# Altium footprint library PcbLib.PcbLib: 79 footprints (part 1 of 5)
Each footprint in its own frame and in the unit in brackets; x right, y up, seen from the top. Pads: shape width x height; smd on the part's side, far side on the other; paste and mask are expansions set on the pad; w line width, h text height; cw(c..) or ccw(c..) is an arc to the next point about the centre after c.
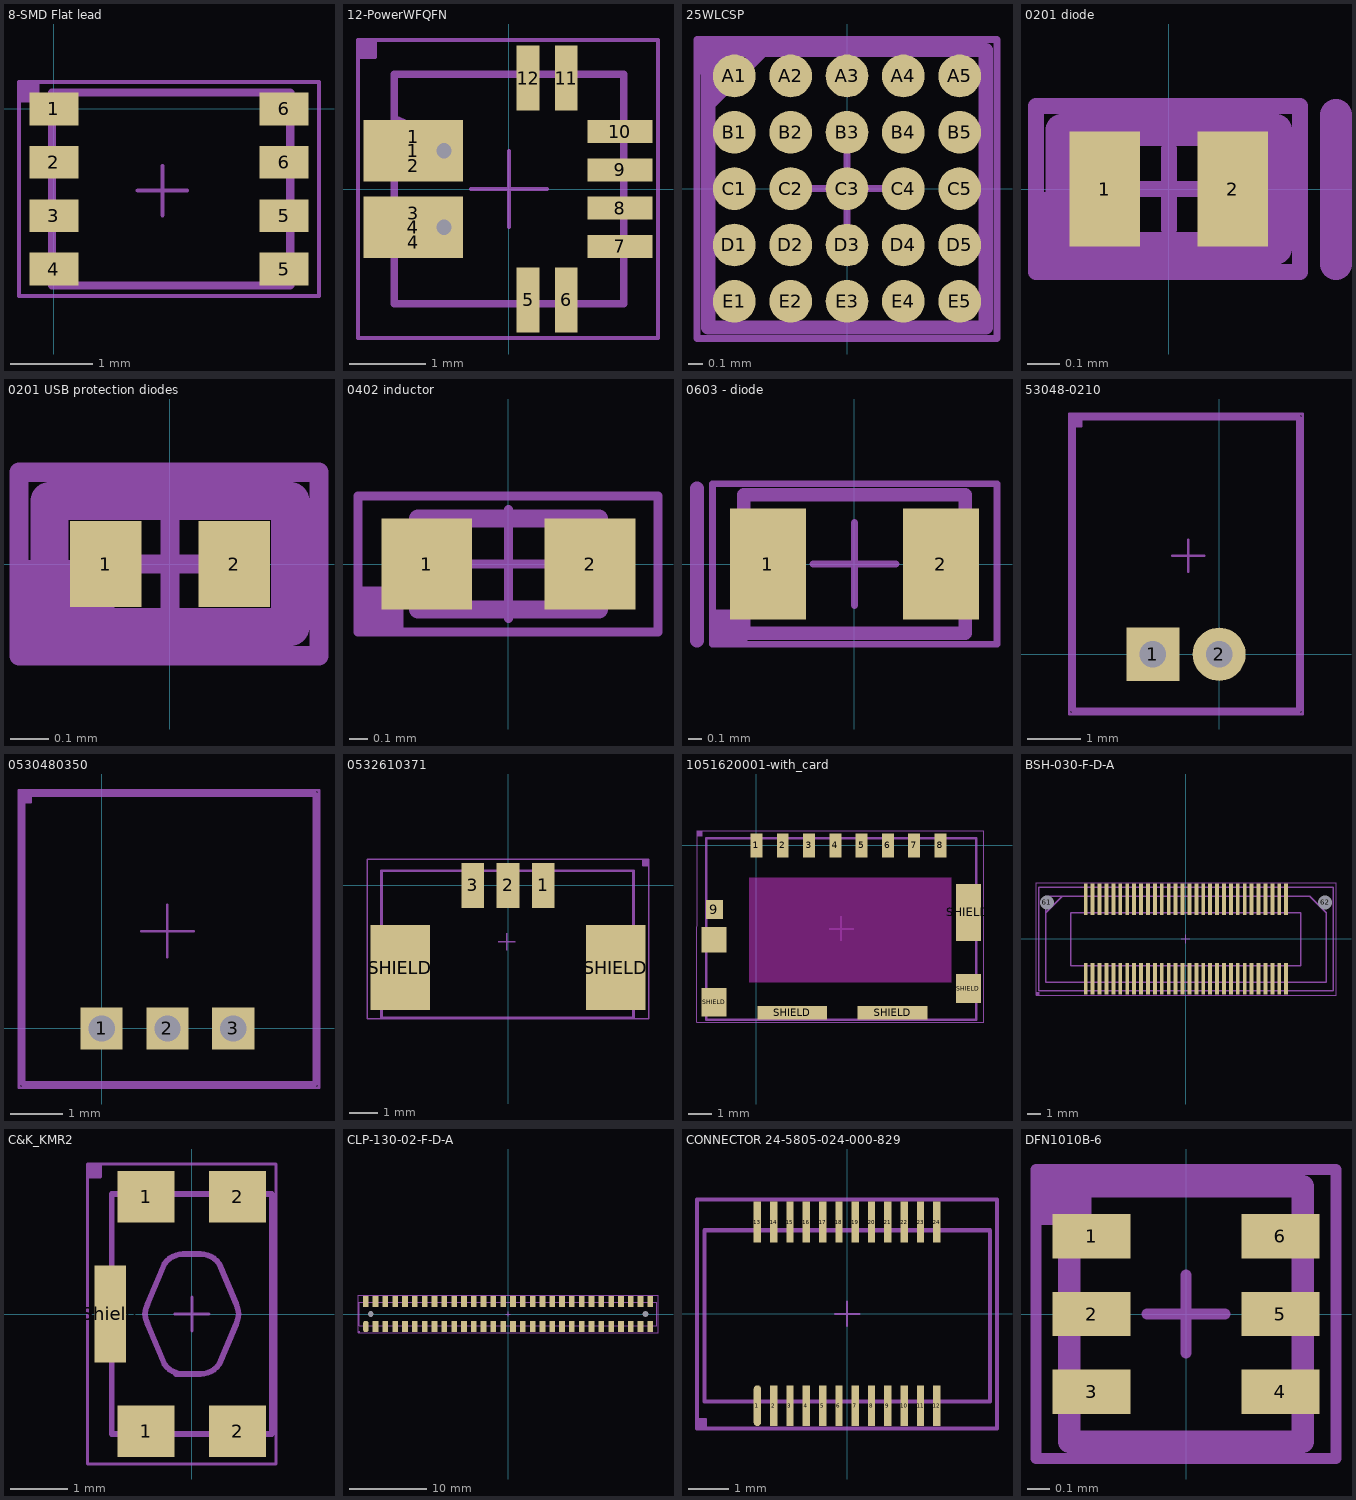
[diagram p0: the footprints below, top view; thin cyan lines are the x and y axes]

## 8-SMD Flat lead [mm]
pads (8):
  rect 0.6x0.4 smd: 1(0,0) 2(0,-0.65) 3(0,-1.3) 4(0,-1.95) 5(2.8,-1.95) 5(2.8,-1.3) 6(2.8,-0.65) 6(2.8,0)
TopBody:
  lines w0.1: -0.025,-2.15 2.875,-2.15 2.875,0.2 -0.025,0.2 -0.025,-2.15
TopCourtyard:
  region: -0.425,0.325 -0.425,0.1 -0.2,0.1 -0.2,0.325
  lines w0.05: -0.425,0.1 -0.2,0.1 -0.2,0.325 ; 1.02,-0.995 1.62,-0.995 ; 1.32,-1.295 1.32,-0.695 ; -0.425,-2.275 3.225,-2.275 3.225,0.325 -0.425,0.325 -0.425,-2.275
3D body: height 0.9, standoff 0, extent -0.025,-2.15 2.875,0.2

## 12-PowerWFQFN [mm]
height 0.75
pads (14):
  rect 1.3x0.8 smd mask+0.05: 1(-1.25,0.5) 4(-1.25,-0.5)
  rect 0.5x0.3 smd paste-0.5 mask+0.05: 1(-1.25,0.682) 2(-1.25,0.301) 3(-1.25,-0.318) 4(-1.25,-0.699)
  rect 0.3x0.85 smd mask+0.05: 5(0.25,-1.45) 6(0.75,-1.45) 11(0.75,1.45) 12(0.25,1.45)
  rect 0.85x0.3 smd mask+0.05: 7(1.45,-0.75) 8(1.45,-0.25) 9(1.45,0.25) 10(1.45,0.75)
via -0.85,0.5 diameter 0.4 hole 0.2
via -0.85,-0.5 diameter 0.4 hole 0.2
TopBody:
  lines w0.1: -1.5,0.44 -0.96,0.68 -1.5,0.92 ; -1.5,-1.5 1.5,-1.5 1.5,1.5 -1.5,1.5 -1.5,-1.5
TopCourtyard:
  region: -1.975,1.95 -1.975,1.725 -1.75,1.725 -1.75,1.95
  lines w0.05: -1.975,1.725 -1.75,1.725 -1.75,1.95 ; -0.5,0 0,0 ; 0,-0.5 0,0 ; 0,0.5 0,0 ; 0.5,0 0,0 ; -1.975,-1.95 1.95,-1.95 1.95,1.95 -1.975,1.95 -1.975,-1.95
3D body: height 0.59, standoff 0, extent 4.95,5.175 4.95,5.175
3D body "EX.STEP": height 0.74, standoff 0.01, extent -1.5,-1.5 1.5,1.5

## 25WLCSP [mm]
height 0.56
pads (25):
  round 0.304 smd paste-0.039 mask-0.039: A1(-0.8,0.8) A2(-0.4,0.8) A3(0,0.8) A4(0.4,0.8) A5(0.8,0.8) B1(-0.8,0.4) B2(-0.4,0.4) B3(0,0.4) B4(0.4,0.4) B5(0.8,0.4) C1(-0.8,0) C2(-0.4,0) C3(0,0) C4(0.4,0) C5(0.8,0) D1(-0.8,-0.4) D2(-0.4,-0.4) D3(0,-0.4) D4(0.4,-0.4) D5(0.8,-0.4) E1(-0.8,-0.8) E2(-0.4,-0.8) E3(0,-0.8) E4(0.4,-0.8) E5(0.8,-0.8)
TopBody:
  lines w0.1: -0.984,0.602 -0.611,0.975 ; -0.985,-0.985 0.985,-0.985 0.985,0.985 -0.985,0.985 -0.985,-0.985
TopCourtyard:
  region: -1.065,1.06 -1.065,0.835 -0.84,0.835 -0.84,1.06
  lines w0.05: -1.065,0.835 -0.84,0.835 -0.84,1.06 ; -0.3,0 0.3,0 ; 0,-0.3 0,0.3 ; -1.065,-1.065 -1.065,1.06 1.065,1.06 1.065,-1.065 -1.065,-1.065
3D body: height 0.57, standoff 0.56, extent -0.906,0.706 -0.706,0.905
3D body: height 0.56, standoff 0, extent -0.985,-0.985 0.985,0.985

## 0201 diode [mm] "for 0201 mcsemi diode"
height 0.3
pads (2):
  rect 0.22x0.36 smd mask+0.05: 1(-0.2,0) 2(0.2,0)
Top Solder:
  rectangle: -0.195,-0.23 0.195,0.23
TopBody:
  lines w0.1: -0.335,-0.185 0.335,-0.185 0.335,0.185 -0.335,0.185 -0.335,-0.185
TopCourtyard:
  rectangle: -0.415,-0.26 -0.19,-0.035
  lines w0.05: -0.415,-0.035 -0.19,-0.035 -0.19,-0.26 ; -0.155,0 0.16,0 ; 0,-0.125 0,0.125 ; -0.415,-0.26 -0.415,0.26 0.41,0.26 0.41,-0.26 -0.415,-0.26
  lines w0.1: 0.522,-0.235 0.522,0.231
3D body: height 0.25, standoff 0, extent 1.325,0.2 1.325,0.2
3D body: height 0.34, standoff 0, extent 0.175,-0.185 0.335,0.185
3D body: height 0.34, standoff 0, extent -0.335,-0.185 0.175,0.185

## 0201 USB protection diodes [mm] "USB PROTECTION ST"
height 0.3
pads (2):
  rect 0.187x0.225 smd: 1(-0.169,0) 2(0.169,0)
TopBody:
  lines w0.1: -0.315,-0.165 0.315,-0.165 0.315,0.165 -0.315,0.165 -0.315,-0.165
TopCourtyard:
  rectangle: -0.395,-0.24 -0.17,-0.015
  lines w0.05: -0.395,-0.015 -0.17,-0.015 -0.17,-0.24 ; -0.165,0 0.165,0 ; 0,-0.165 0,0.165 ; -0.395,-0.24 0.39,-0.24 0.39,0.24 -0.395,0.24 -0.395,-0.24
3D body: height 0.3, standoff 0, extent 0.175,-0.164 0.315,0.165
3D body: height 0.3, standoff 0, extent -0.314,-0.164 0.175,0.165

## 0402 inductor [mm]
height 0.5
pads (2):
  rect 0.5x0.5 smd: 1(-0.45,0) 2(0.45,0)
TopBody:
  lines w0.1: -0.5,-0.25 0.5,-0.25 0.5,0.25 -0.5,0.25 -0.5,-0.25
TopCourtyard:
  rectangle: -0.83,-0.375 -0.605,-0.15
  lines w0.05: -0.83,-0.15 -0.605,-0.15 -0.605,-0.375 ; -0.3,0 0.3,0 ; 0,-0.3 0,0.3 ; -0.83,-0.375 0.825,-0.375 0.825,0.375 -0.83,0.375 -0.83,-0.375
3D body: height 0.5, standoff 0, extent -0.5,-0.25 -0.4,0.25
3D body: height 0.5, standoff 0, extent -0.4,-0.25 0.4,0.25
3D body: height 0.5, standoff 0, extent 0.4,-0.25 0.5,0.25

## 0603 - diode [mm]
height 0.55
pads (2):
  rect 0.55x0.8 smd paste-0.015: 1(-0.625,0) 2(0.625,0)
TopBody:
  lines w0.1: -0.8,-0.5 -0.8,0.5 0.8,0.5 0.8,-0.5 -0.8,-0.5
TopCourtyard:
  region: -1.025,-0.355 -1.025,-0.58 -0.8,-0.58 -0.8,-0.355
  lines w0.05: -1.025,-0.355 -0.8,-0.355 -0.8,-0.58 ; -0.3,0 0.3,0 ; 0,-0.3 0,0.3 ; -1.025,-0.58 -1.025,0.58 1.03,0.58 1.03,-0.58 -1.025,-0.58
  lines w0.1: -1.138,-0.555 -1.138,0.546
3D body: height 0.51, standoff 0.5, extent -0.72,-0.421 -0.521,-0.221
3D body: height 0.5, standoff 0, extent -0.8,-0.5 0.8,0.5

## 53048-0210 [mm]
height 3.5
pads (2):
  rect 1x1 hole 0.5: 1(-1.25,0)
  round 1 hole 0.5: 2(0,0)
TopBody:
  lines w0.1: -2.75,-1.05 1.5,-1.05 1.5,4.45 -2.75,4.45 -2.75,-1.05
TopCourtyard:
  region: -2.825,4.525 -2.825,4.3 -2.6,4.3 -2.6,4.525
  lines w0.05: -2.825,4.3 -2.6,4.3 -2.6,4.525 ; -0.885,1.855 -0.285,1.855 ; -0.585,1.555 -0.585,2.155 ; -2.825,-1.125 -2.825,4.525 1.575,4.525 1.575,-1.125 -2.825,-1.125
3D body "530480210.stp": height 3.5, standoff -2.3, extent -2.75,-1.05 1.5,4.45

## 0530480350 [mm]
height 3.5
pads (3):
  rect 0.8x0.8 / inner round 0.8 / far side rect 0.8x0.8 hole 0.5: 1(0,0) 2(1.25,0) 3(2.5,0)
TopBody:
  lines w0.1: -1.495,-1.05 -1.495,4.45 4.055,4.45 4.055,-1.05 -1.495,-1.05
TopCourtyard:
  region: -1.57,4.525 -1.57,4.3 -1.345,4.3 -1.345,4.525
  lines w0.05: -1.57,4.3 -1.345,4.3 -1.345,4.525 ; 0.75,1.85 1.25,1.85 ; 1.25,1.35 1.25,1.85 ; 1.25,2.35 1.25,1.85 ; 1.75,1.85 1.25,1.85 ; -1.57,-1.125 -1.57,4.525 4.13,4.525 4.13,-1.125 -1.57,-1.125
3D body "530480310.stp": height 3.19, standoff -2.61, extent -1.495,-1.05 4.005,4.45

## 0532610371 [mm]
height 3.4
pads (5):
  rect 0.8x1.6 smd: 1(1.25,0) 2(0,0) 3(-1.25,0)
  rect 2.1x3 smd: SHIELD(-3.8,-2.9) SHIELD(3.8,-2.9)
TopBody:
  lines w0.1: -4.47,-4.68 -4.47,0.52 4.43,0.52 4.43,-4.68 -4.47,-4.68
TopCourtyard:
  region: 4.755,0.925 4.755,0.7 4.98,0.7 4.98,0.925
  lines w0.05: -0.35,-1.995 0.25,-1.995 ; -0.05,-2.295 -0.05,-1.695 ; 4.755,0.925 4.755,0.7 4.98,0.7 ; -4.975,-4.71 4.98,-4.71 4.98,0.925 -4.975,0.925 -4.975,-4.71
3D body "532610371.stp": height 3.39, standoff -0.01, extent -4.47,-4.68 4.43,0.52

## 1051620001-with_card [mm]
height 1.45
pads (15):
  rect 0.5x1 smd: 1(0,0) 2(1.1,0) 3(2.2,0) 4(3.3,0) 5(4.4,0) 6(5.5,0) 7(6.6,0) 8(7.7,0)
  rect 0.72x0.79 smd: 9(-1.76,-2.685)
  rect 1.05x1.2 smd: SHIELD(-1.775,-6.56) SHIELD(8.875,-5.99)
  rect 1.05x1.08 smd: SHIELD(-1.775,-3.95)
  rect 2.91x0.55 smd: SHIELD(1.505,-7) SHIELD(5.695,-7)
  rect 1.05x2.39 smd: SHIELD(8.875,-2.805)
Top Layer keep-out:
  region: 8.16,-1.345 -0.32,-1.345 -0.32,-5.735 8.16,-5.735
TopBody:
  lines w0.1: -2.1,-7.29 -2.1,0.31 9.2,0.31 9.2,-7.29 -2.1,-7.29
TopCourtyard:
  region: -2.49,0.625 -2.49,0.4 -2.265,0.4 -2.265,0.625
  lines w0.05: -2.49,0.4 -2.265,0.4 -2.265,0.625 ; 3.05,-3.49 3.55,-3.49 ; 3.55,-3.99 3.55,-3.49 ; 3.55,-2.99 3.55,-3.49 ; 4.05,-3.49 3.55,-3.49 ; -2.49,-7.4 -2.49,0.625 9.525,0.625 9.525,-7.4 -2.49,-7.4
3D body "MicroSD.stp": height 2.2, standoff 0.55, extent -2.465,-7.1 8.715,7.96
3D body "1051620001.stp": height 1.44, standoff -0.01, extent -2.1,-7.29 9.2,0.31

## BSH-030-F-D-A [mm]
height 3.25
pads (62):
  rect 0.279x2.273 smd mask+0.05: 1(-7.225,-2.871) 2(-7.225,2.857) 3(-6.725,-2.871) 4(-6.725,2.857) 5(-6.225,-2.871) 6(-6.225,2.857) 7(-5.725,-2.871) 8(-5.725,2.857) 9(-5.225,-2.871) 10(-5.225,2.857) 11(-4.725,-2.871) 12(-4.725,2.857) 13(-4.225,-2.871) 14(-4.225,2.857) 15(-3.725,-2.871) 16(-3.725,2.857) 17(-3.225,-2.871) 18(-3.225,2.857) 19(-2.725,-2.871) 20(-2.725,2.857) 21(-2.225,-2.871) 22(-2.225,2.857) 23(-1.725,-2.871) 24(-1.725,2.857) 25(-1.225,-2.871) 26(-1.225,2.857) 27(-0.725,-2.871) 28(-0.725,2.857) 29(-0.225,-2.871) 30(-0.225,2.857) 31(0.275,-2.871) 32(0.275,2.857) 33(0.775,-2.871) 34(0.775,2.857) 35(1.275,-2.871) 36(1.275,2.857) 37(1.775,-2.871) 38(1.775,2.857) 39(2.275,-2.871) 40(2.275,2.857) 41(2.775,-2.871) 42(2.775,2.857) 43(3.275,-2.871) 44(3.275,2.857) 45(3.775,-2.871) 46(3.775,2.857) 47(4.275,-2.871) 48(4.275,2.857) 49(4.775,-2.871) 50(4.775,2.857) 51(5.275,-2.871) 52(5.275,2.857) 53(5.775,-2.871) 54(5.775,2.857) 55(6.275,-2.871) 56(6.275,2.857) 57(6.775,-2.871) 58(6.775,2.857) 59(7.275,-2.871) 60(7.275,2.857)
  round 0.8 hole 1.016 unplated mask+0.358: 61(-10.038,2.641) 62(10.088,2.641)
TopBody:
  lines w0.1: -8.917,3.086 -10.117,3.086 -10.117,1.88 -8.917,3.086 ; -8.917,3.086 -10.117,1.886 -10.117,-3.137 10.167,-3.137 10.167,1.886 8.967,3.086 -8.917,3.086 ; -10.625,-3.75 10.675,-3.75 10.675,3.721 -10.625,3.721 -10.625,-3.75 ; -8.295,-1.93 -8.295,1.88 8.345,1.88 8.345,-1.93 -8.295,-1.93
TopCourtyard:
  region: -10.825,-3.855 -10.825,-4.08 -10.6,-4.08 -10.6,-3.855
  lines w0.05: -10.825,-3.855 -10.6,-3.855 -10.6,-4.08 ; -0.3,0 0.3,0 ; 0,-0.3 0,0.3 ; -10.825,-4.08 10.88,-4.08 10.88,4.07 -10.825,4.07 -10.825,-4.08
3D body "BSH-030-01-F-D-A.stp": height 3.25, standoff -0.75, extent -10.6,-3.772 10.672,3.721

## C&K_KMR2 [mm]
pads (5):
  rect 1x0.9 smd: 1(-0.8,2.05) 1(-0.8,-2.05) 2(0.8,2.05) 2(0.8,-2.05)
  rect 0.55x1.7 smd: Shield(-1.425,0)
TopBody:
  lines w0.1: -1.4,-2.1 1.4,-2.1 1.4,2.1 0.6,2.1 -0.6,2.1 -1.4,2.1 -1.4,-2.1 ; -1.1,-2.1 -1.1,-2.3 -0.5,-2.3 -0.5,-2.1 ; -1.1,2.1 -1.1,2.3 -0.5,2.3 -0.5,2.1 ; -0.278,-1.05 0,-1.05 ; 0.5,-2.1 0.5,-2.3 1.1,-2.3 1.1,-2.1 ; 0.5,2.1 0.5,2.3 1.1,2.3 1.1,2.1 ; 0,-1.05 0.15,-1.05 ccw(c0.15,-0.65) 0.479,-0.878 0.775,-0.175 ccw(c0.275,0.05) 0.821,0 ccw(c0.275,-0.05) 0.775,0.175 0.479,0.878 ccw(c0.15,0.65) 0.15,1.05 0,1.05 -0.15,1.05 ccw(c-0.15,0.65) -0.479,0.878 -0.775,0.175 ccw(c-0.275,-0.05) -0.821,0 ccw(c-0.275,0.05) -0.775,-0.175 -0.479,-0.878 ccw(c-0.15,-0.65) -0.15,-1.05 0,-1.05
TopCourtyard:
  region: -1.825,2.625 -1.825,2.4 -1.6,2.4 -1.6,2.625
  lines w0.05: -1.825,2.4 -1.6,2.4 -1.6,2.625 ; -0.3,0 0.3,0 ; 0,-0.3 0,0.3 ; -1.825,-2.625 1.475,-2.625 1.475,2.625 -1.825,2.625 -1.825,-2.625
3D body "KMR2.STEP": height 1.9, standoff 0, extent -1.4,-2.3 1.4,2.3

## CLP-130-02-F-D-A [mil]
pads (62):
  oval 29x58 smd mask+2: 1(-725,-63.5)
  rect 29x58 smd mask+2: 2(-725,63.5) 3(-675,-63.5) 4(-675,63.5) 5(-625,-63.5) 6(-625,63.5) 7(-575,-63.5) 8(-575,63.5) 9(-525,-63.5) 10(-525,63.5) 11(-475,-63.5) 12(-475,63.5) 13(-425,-63.5) 14(-425,63.5) 15(-375,-63.5) 16(-375,63.5) 17(-325,-63.5) 18(-325,63.5) 19(-275,-63.5) 20(-275,63.5) 21(-225,-63.5) 22(-225,63.5) 23(-175,-63.5) 24(-175,63.5) 25(-125,-63.5) 26(-125,63.5) 27(-75,-63.5) 28(-75,63.5) 29(-25,-63.5) 30(-25,63.5) 31(25,-63.5) 32(25,63.5) 33(75,-63.5) 34(75,63.5) 35(125,-63.5) 36(125,63.5) 37(175,-63.5) 38(175,63.5) 39(225,-63.5) 40(225,63.5) 41(275,-63.5) 42(275,63.5) 43(325,-63.5) 44(325,63.5) 45(375,-63.5) 46(375,63.5) 47(425,-63.5) 48(425,63.5) 49(475,-63.5) 50(475,63.5) 51(525,-63.5) 52(525,63.5) 53(575,-63.5) 54(575,63.5) 55(625,-63.5) 56(625,63.5) 57(675,-63.5) 58(675,63.5) 59(725,-63.5) 60(725,63.5)
  round 0 hole 29 unplated: 61(-700,0) 62(700.39,0)
TopBody:
  lines w3.94: -758.5,-60 -758.5,60 757.87,60 757.87,-60 -758.5,-60
TopCourtyard:
  region: -764.57,-86.61 -764.57,-95.47 -755.7,-95.47 -755.7,-86.61
  lines w1.97: -764.57,-86.61 -755.7,-86.61 -755.7,-95.47 ; -11.81,0 11.81,0 ; 0,-11.81 0,11.81 ; -764.57,-95.47 763.78,-95.47 763.78,95.47 -764.57,95.47 -764.57,-95.47
3D body "CLP-130-02-F-D-A.stp": height 88.94, standoff -20.06, extent -758.86,-85.98 758.14,84.01

## CONNECTOR 24-5805-024-000-829 [mm]
pads (24):
  oval 0.18x1 smd mask+0: 1(-2.2,-2.25)
  rect 0.18x1 smd mask+0: 2(-1.8,-2.25) 3(-1.4,-2.25) 4(-1,-2.25) 5(-0.6,-2.25) 6(-0.2,-2.25) 7(0.2,-2.25) 8(0.6,-2.25) 9(1,-2.25) 10(1.4,-2.25) 11(1.8,-2.25) 12(2.2,-2.25) 13(-2.2,2.25) 14(-1.8,2.25) 15(-1.4,2.25) 16(-1,2.25) 17(-0.6,2.25) 18(-0.2,2.25) 19(0.2,2.25) 20(0.6,2.25) 21(1,2.25) 22(1.4,2.25) 23(1.8,2.25) 24(2.2,2.25)
TopBody:
  lines w0.1: -3.5,-2.15 3.5,-2.15 3.5,2.05 -3.5,2.05 -3.5,-2.15
TopCourtyard:
  region: -3.68,-2.58 -3.68,-2.805 -3.455,-2.805 -3.455,-2.58
  lines w0.05: -3.68,-2.58 -3.455,-2.58 -3.455,-2.805 ; -0.3,0 0.3,0 ; 0,-0.3 0,0.3
  lines w0.1: -3.68,-2.805 3.675,-2.805 3.675,2.8 -3.68,2.8 -3.68,-2.805
3D body: height 1, standoff 0.1, extent -3.5,-2.15 3.5,2.05

## DFN1010B-6 [mm]
height 0.4
pads (6):
  rect 0.35x0.2 smd paste+0 mask+0.05: 1(-0.425,0.35) 2(-0.425,0) 3(-0.425,-0.35) 4(0.425,-0.35) 5(0.425,0) 6(0.425,0.35)
Top Solder:
  region: 0.65,-0.501 0.201,-0.501 0.201,0.498 0.65,0.498
  region: -0.65,0.5 -0.201,0.5 -0.201,-0.499 -0.65,-0.499
TopBody:
  lines w0.1: -0.525,-0.575 0.525,-0.575 0.525,0.575 -0.525,0.575 -0.525,-0.575
TopCourtyard:
  region: -0.675,0.65 -0.675,0.425 -0.45,0.425 -0.45,0.65
  lines w0.05: -0.675,0.425 -0.45,0.425 -0.45,0.65 ; -0.175,0 0,0 ; 0,-0.175 0,0 ; 0,0.175 0,0 ; 0.175,0 0,0 ; -0.675,-0.65 -0.675,0.65 0.675,0.65 0.675,-0.65 -0.675,-0.65
3D body: height 0.25, standoff 0, extent 0,0 0,0
3D body: height 0.4, standoff 0, extent -0.53,-0.575 0.525,0.575
3D body: height 0.41, standoff 0.4, extent -0.397,0.444 -0.265,0.483